# Altium footprint library 2020-09-26_17-27-19.PcbLib: 69 footprints (part 4 of 5)
Each footprint in its own frame and in the unit in brackets; x right, y up, seen from the top. Pads: shape width x height; smd on the part's side, far side on the other; paste and mask are expansions set on the pad; w line width, h text height; cw(c..) or ccw(c..) is an arc to the next point about the centre after c.
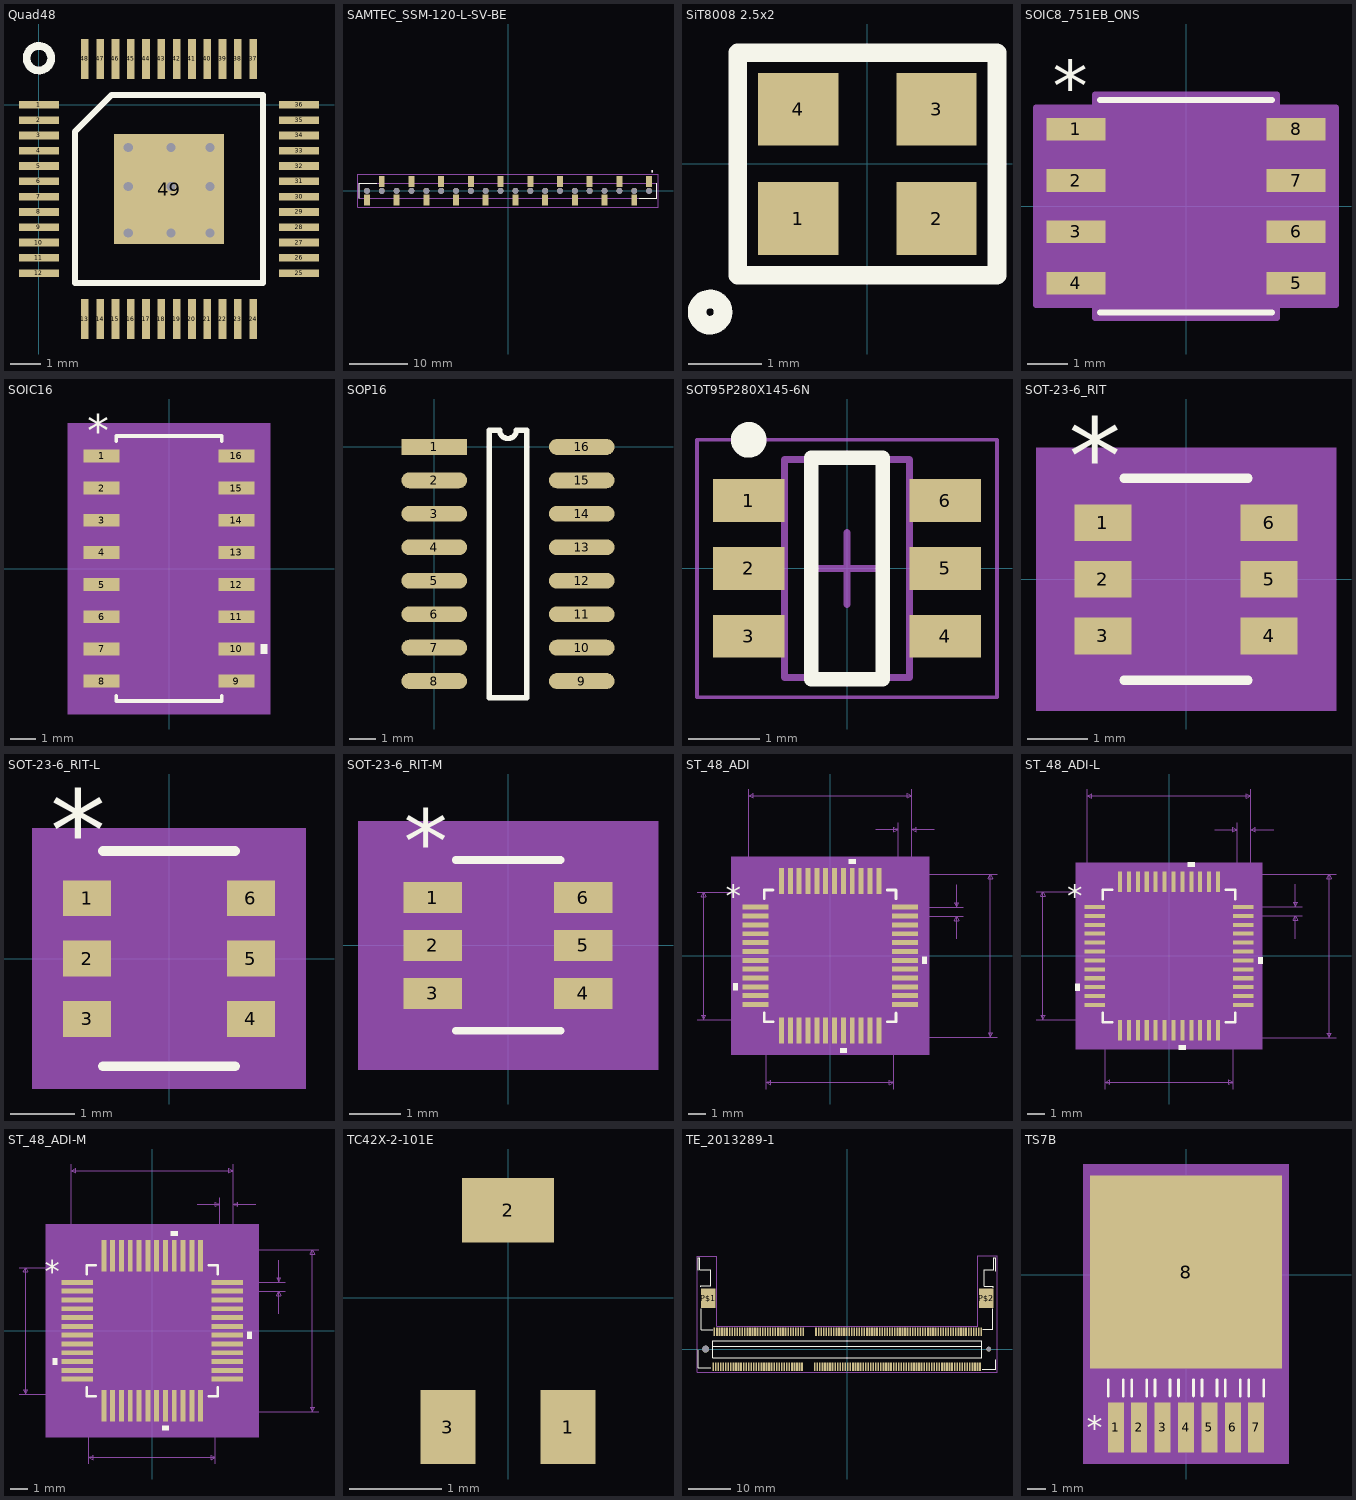
[diagram p3: the footprints below, top view; thin cyan lines are the x and y axes]

## Quad48 [mm]
pads (49):
  rect 1.3x0.25 smd: 1(0,0) 2(0,-0.5) 3(0,-1) 4(0,-1.5) 5(0,-2) 6(0,-2.5) 7(0,-3) 8(0,-3.5) 9(0,-4) 10(0,-4.5) 11(0,-5) 12(0,-5.5) 25(8.5,-5.5) 26(8.5,-5) 27(8.5,-4.5) 28(8.5,-4) 29(8.5,-3.5) 30(8.5,-3) 31(8.5,-2.5) 32(8.5,-2) 33(8.5,-1.5) 34(8.5,-1) 35(8.5,-0.5) 36(8.5,0)
  rect 0.25x1.3 smd: 13(1.5,-7) 14(2,-7) 15(2.5,-7) 16(3,-7) 17(3.5,-7) 18(4,-7) 19(4.5,-7) 20(5,-7) 21(5.5,-7) 22(6,-7) 23(6.5,-7) 24(7,-7) 37(7,1.5) 38(6.5,1.5) 39(6,1.5) 40(5.5,1.5) 41(5,1.5) 42(4.5,1.5) 43(4,1.5) 44(3.5,1.5) 45(3,1.5) 46(2.5,1.5) 47(2,1.5) 48(1.5,1.5)
  rect 3.6x3.6 smd: 49(4.25,-2.75)
via 4.318,-2.667 diameter 0.5 hole 0.3
via 2.921,-2.667 diameter 0.5 hole 0.3
via 2.921,-4.191 diameter 0.5 hole 0.3
via 4.318,-4.191 diameter 0.5 hole 0.3
via 5.588,-4.191 diameter 0.5 hole 0.3
via 5.588,-2.667 diameter 0.5 hole 0.3
via 5.588,-1.397 diameter 0.5 hole 0.3
via 4.318,-1.397 diameter 0.5 hole 0.3
via 2.921,-1.397 diameter 0.5 hole 0.3
Top Overlay:
  circle w0.254: c0,1.524 r0.402
  lines w0.2: 1.185,-5.815 7.315,-5.815 7.315,0.315 2.37,0.315 1.185,-0.87 1.185,-5.815
3D body "SQFP 48 LTC8602.step": height 2, standoff 0, extent -0.25,-7.25 8.75,1.75

## SAMTEC_SSM-120-L-SV-BE [mm]
pads (40):
  rect 1.02x1.905 smd: 01(24.13,1.603) 02(21.59,-1.603) 03(19.05,1.603) 04(16.51,-1.603) 05(13.97,1.603) 06(11.43,-1.603) 07(8.89,1.603) 08(6.35,-1.603) 09(3.81,1.603) 10(1.27,-1.603) 11(-1.27,1.603) 12(-3.81,-1.603) 13(-6.35,1.603) 14(-8.89,-1.603) 15(-11.43,1.603) 16(-13.97,-1.603) 17(-16.51,1.603) 18(-19.05,-1.603) 19(-21.59,1.603) 20(-24.13,-1.603)
  round 1.02 hole 1.02 unplated: ""(-24.13,0) ""(-21.59,0) ""(-19.05,0) ""(-16.51,0) ""(-13.97,0) ""(-11.43,0) ""(-8.89,0) ""(-6.35,0) ""(-3.81,0) ""(-1.27,0) ""(1.27,0) ""(3.81,0) ""(6.35,0) ""(8.89,0) ""(11.43,0) ""(13.97,0) ""(16.51,0) ""(19.05,0) ""(21.59,0) ""(24.13,0)
Top Overlay:
  circle w0.2: c24.64,3.315 r0.1
  lines w0.2: -25.4,-1.27 -25.4,1.27 -22.45,1.27 ; 22.45,-1.27 25.4,-1.27 25.4,1.27
Mechanical 13:
  circle w0.2: c24.64,3.315 r0.1
  lines w0.1: -25.4,-1.27 -25.4,1.27 25.4,1.27 25.4,-1.27 -25.4,-1.27
Mechanical 15:
  lines w0.05: -25.65,-2.805 -25.65,2.805 25.65,2.805 25.65,-2.805 -25.65,-2.805

## SiT8008 2.5x2 [mm]
pads (4):
  rect 1.1x1 smd: 1(-0.95,-0.75) 2(0.95,-0.75) 3(0.95,0.75) 4(-0.95,0.75)
Top Overlay:
  circle w0.254: c-2.159,-2.032 r0.18
  lines w0.254: -1.778,-1.524 -1.778,1.524 1.778,1.524 1.778,-1.524 -1.778,-1.524

## SOIC8_751EB_ONS [mil]
pads (8):
  rect 57.5x22 smd paste+0 mask+0: 1(-107.25,75) 2(-107.25,25) 3(-107.25,-25) 4(-107.25,-75) 5(107.25,-75) 6(107.25,-25) 7(107.25,25) 8(107.25,75)
Top Overlay:
  lines w6: -83.5,-103.5 83.5,-103.5 ; -83.5,103.5 83.5,103.5
  text "*" at -129.75,92 h50
Mechanical 13:
  lines w0: -12,98.5 ccw(c0,98.5) 12,98.5
  lines w1: -122,-85 -122,-65 -78.5,-65 -78.5,-85 -122,-85 ; -122,-35 -122,-15 -78.5,-15 -78.5,-35 -122,-35 ; -122,15 -122,35 -78.5,35 -78.5,15 -122,15 ; -122,65 -122,85 -78.5,85 -78.5,65 -122,65 ; -78.5,-98.5 78.5,-98.5 78.5,98.5 -78.5,98.5 -78.5,-98.5 ; 78.5,-85 78.5,-65 122,-65 122,-85 78.5,-85 ; 78.5,-35 78.5,-15 122,-15 122,-35 78.5,-35 ; 78.5,15 78.5,35 122,35 122,15 78.5,15 ; 78.5,65 78.5,85 122,85 122,65 78.5,65
  text "*" at -76,45.5 h50
Mechanical 15:
  region: -88.5,-96 -146,-96 -146,96 -88.5,96 -88.5,108.5 88.5,108.5 88.5,96 146,96 146,-96 88.5,-96 88.5,-108.5 -88.5,-108.5
  lines w6: -146,-96 -146,96 -88.5,96 -88.5,108.5 88.5,108.5 88.5,96 146,96 146,-96 88.5,-96 88.5,-108.5 -88.5,-108.5 -88.5,-96 -146,-96
3D body "SOIC8_751EB_ONS.step": height 69.09, standoff 0, extent -122.01,-98.5 122.01,98.5

## SOIC16 [mil]
pads (16):
  rect 55.5x20 smd paste+0 mask+0: 1(-104.75,175) 2(-104.75,125) 3(-104.75,75) 4(-104.75,25) 5(-104.75,-25) 6(-104.75,-75) 7(-104.75,-125) 8(-104.75,-175) 9(104.75,-175) 10(104.75,-125) 11(104.75,-75) 12(104.75,-25) 13(104.75,25) 14(104.75,75) 15(104.75,125) 16(104.75,175)
Top Overlay:
  region: 142.5,-117.5 152.5,-117.5 152.5,-132.5 142.5,-132.5
  lines w6: -82,-198.1 -82,-206 82,-206 82,-198.1 ; -82,198.1 -82,206 82,206 82,198.1
  text "*" at -127.25,190 h50
Mechanical 5:
  region: 157.5,-226 -157.5,-226 -157.5,226 157.5,226
Mechanical 13:
  lines w0: -12,201 ccw(c0,201) 12,201
  lines w1: -118.5,-184 -118.5,-166 -77,-166 -77,-184 -118.5,-184 ; -118.5,-134 -118.5,-116 -77,-116 -77,-134 -118.5,-134 ; -118.5,-84 -118.5,-66 -77,-66 -77,-84 -118.5,-84 ; -118.5,-34 -118.5,-16 -77,-16 -77,-34 -118.5,-34 ; -118.5,16 -118.5,34 -77,34 -77,16 -118.5,16 ; -118.5,66 -118.5,84 -77,84 -77,66 -118.5,66 ; -118.5,116 -118.5,134 -77,134 -77,116 -118.5,116 ; -118.5,166 -118.5,184 -77,184 -77,166 -118.5,166 ; -77,-201 77,-201 77,201 -77,201 -77,-201 ; 77,-184 77,-166 118.5,-166 118.5,-184 77,-184 ; 77,-134 77,-116 118.5,-116 118.5,-134 77,-134 ; 77,-84 77,-66 118.5,-66 118.5,-84 77,-84 ; 77,-34 77,-16 118.5,-16 118.5,-34 77,-34 ; 77,16 77,34 118.5,34 118.5,16 77,16 ; 77,66 77,84 118.5,84 118.5,66 77,66 ; 77,116 77,134 118.5,134 118.5,116 77,116 ; 77,166 77,184 118.5,184 118.5,166 77,166
  text "*" at -74.5,148 h50
Mechanical 15:
  region: -87,-195 -142.5,-195 -142.5,195 -87,195 -87,211 87,211 87,195 142.5,195 142.5,-195 87,-195 87,-211 -87,-211
  lines w6: -142.5,-195 -142.5,195 -87,195 -87,211 87,211 87,195 142.5,195 142.5,-195 87,-195 87,-211 -87,-211 -87,-195 -142.5,-195
3D body "SOIC16_z90.stp": height 61.42, standoff 0, extent -118.11,-200.78 118.11,200.79
3D body: height 10, standoff 0, extent 0,0 10,10

## SOP16 [mm]
pads (16):
  rect 2.5x0.6 smd: 1(0,0)
  oval 2.5x0.6 smd: 2(0,-1.27) 3(0,-2.54) 4(0,-3.81) 5(0,-5.08) 6(0,-6.35) 7(0,-7.62) 8(0,-8.89) 9(5.6,-8.89) 10(5.6,-7.62) 11(5.6,-6.35) 12(5.6,-5.08) 13(5.6,-3.81) 14(5.6,-2.54) 15(5.6,-1.27) 16(5.6,0)
Top Overlay:
  lines w0.2: 2.085,-9.525 3.515,-9.525 3.515,0.635 3.117,0.635 cw(c2.8,0.635) 2.482,0.635 2.085,0.635 2.085,-9.525

## SOT95P280X145-6N [mm] "SOT23, 6-Leads, Body 2.90x2.80mm, Pitch 0.95mm, IPC Medium Density"
height 1.45
pads (6):
  rect 1x0.6 smd: 1(-1.375,0.95) 2(-1.375,0) 3(-1.375,-0.95) 4(1.375,-0.95) 5(1.375,0) 6(1.375,0.95)
Top Overlay:
  circle w0.25: c-1.375,1.8 r0.125
  lines w0.2: -0.5,-1.55 -0.5,1.55 0.5,1.55 0.5,-1.55 -0.5,-1.55
Mechanical 13:
  lines w0.1: -0.875,-1.525 0.875,-1.525 0.875,1.525 -0.875,1.525 -0.875,-1.525
Mechanical 15:
  lines w0.05: -2.1,-1.8 2.1,-1.8 2.1,1.8 -2.1,1.8 -2.1,-1.8
  lines w0.1: -0.5,0 0.5,0 ; 0,-0.5 0,0.5
3D body "SOT95P280X145-6N.step": height 1.45, standoff 0, extent -1.5,-1.525 1.5,1.525

## SOT-23-6_RIT [mil]
pads (6):
  rect 37.5x24 smd paste+0 mask+0: 1(-54.25,37) 2(-54.25,0) 3(-54.25,-37) 4(54.25,-37) 5(54.25,0) 6(54.25,37)
Top Overlay:
  lines w6: -40.5,-66 40.5,-66 ; -40.5,66 40.5,66
  text "*" at -76.75,56 h50
Mechanical 5:
  region: 98,-86 -98,-86 -98,86 98,86
Mechanical 13:
  lines w0: -12,61 ccw(c0,61) 12,61
  lines w1: -59,-48 -35.5,-48 -35.5,-26 -59,-26 -59,-48 ; -59,-11 -35.5,-11 -35.5,11 -59,11 -59,-11 ; -59,26 -35.5,26 -35.5,48 -59,48 -59,26 ; -35.5,-61 -35.5,61 35.5,61 35.5,-61 -35.5,-61 ; 35.5,-48 59,-48 59,-26 35.5,-26 35.5,-48 ; 35.5,-11 59,-11 59,11 35.5,11 35.5,-11 ; 35.5,26 59,26 59,48 35.5,48 35.5,26
  text "*" at -33,8 h50
Mechanical 15:
  region: -45.5,-59 -83,-59 -83,59 -45.5,59 -45.5,71 45.5,71 45.5,59 83,59 83,-59 45.5,-59 45.5,-71 -45.5,-71
  lines w6: -83,-59 -45.5,-59 -45.5,-71 45.5,-71 45.5,-59 83,-59 83,59 45.5,59 45.5,71 -45.5,71 -45.5,59 -83,59 -83,-59
3D body "SOT-23-6_RIT.step": height 51.1, standoff 0, extent -59.02,-60.98 59.02,60.98

## SOT-23-6_RIT-L [mil]
pads (6):
  rect 29.5x22 smd paste+0 mask+0: 1(-50.25,37) 2(-50.25,0) 3(-50.25,-37) 4(50.25,-37) 5(50.25,0) 6(50.25,37)
Top Overlay:
  lines w6: -40.5,-66 40.5,-66 ; -40.5,66 40.5,66
  text "*" at -72.75,54 h50
Mechanical 5:
  region: 84,-80 -84,-80 -84,80 84,80
Mechanical 13:
  lines w0: -12,61 ccw(c0,61) 12,61
  lines w1: -59,-48 -59,-26 -35.5,-26 -35.5,-48 -59,-48 ; -59,-11 -59,11 -35.5,11 -35.5,-11 -59,-11 ; -59,26 -59,48 -35.5,48 -35.5,26 -59,26 ; -35.5,-61 35.5,-61 35.5,61 -35.5,61 -35.5,-61 ; 35.5,-48 35.5,-26 59,-26 59,-48 35.5,-48 ; 35.5,-11 35.5,11 59,11 59,-11 35.5,-11 ; 35.5,26 35.5,48 59,48 59,26 35.5,26
  text "*" at -33,8 h50
Mechanical 15:
  region: -39.5,-52 -69,-52 -69,52 -39.5,52 -39.5,65 39.5,65 39.5,52 69,52 69,-52 39.5,-52 39.5,-65 -39.5,-65
  lines w6: -69,-52 -69,52 -39.5,52 -39.5,65 39.5,65 39.5,52 69,52 69,-52 39.5,-52 39.5,-65 -39.5,-65 -39.5,-52 -69,-52
3D body "SOT-23-6_RIT.step": height 51.1, standoff 0, extent -59.02,-60.98 59.02,60.98

## SOT-23-6_RIT-M [mil]
pads (6):
  rect 45.5x24 smd paste+0 mask+0: 1(-58.25,37) 2(-58.25,0) 3(-58.25,-37) 4(58.25,-37) 5(58.25,0) 6(58.25,37)
Top Overlay:
  lines w6: -40.5,-66 40.5,-66 ; -40.5,66 40.5,66
  text "*" at -80.75,56 h50
Mechanical 5:
  region: 116,-96 -116,-96 -116,96 116,96
Mechanical 13:
  lines w0: -12,61 ccw(c0,61) 12,61
  lines w1: -59,-48 -59,-26 -35.5,-26 -35.5,-48 -59,-48 ; -59,-11 -59,11 -35.5,11 -35.5,-11 -59,-11 ; -59,26 -59,48 -35.5,48 -35.5,26 -59,26 ; -35.5,-61 35.5,-61 35.5,61 -35.5,61 -35.5,-61 ; 35.5,-48 35.5,-26 59,-26 59,-48 35.5,-48 ; 35.5,-11 35.5,11 59,11 59,-11 35.5,-11 ; 35.5,26 35.5,48 59,48 59,26 35.5,26
  text "*" at -33,8 h50
Mechanical 15:
  region: -55.5,-69 -101,-69 -101,69 -55.5,69 -55.5,81 55.5,81 55.5,69 101,69 101,-69 55.5,-69 55.5,-81 -55.5,-81
  lines w6: -101,-69 -101,69 -55.5,69 -55.5,81 55.5,81 55.5,69 101,69 101,-69 55.5,-69 55.5,-81 -55.5,-81 -55.5,-69 -101,-69
3D body "SOT-23-6_RIT.step": height 51.1, standoff 0, extent -59.02,-60.98 59.02,60.98

## ST_48_ADI [mil]
pads (48):
  rect 58x11 smd paste+0 mask+0: 1(-166,108.27) 2(-166,88.58) 3(-166,68.9) 4(-166,49.21) 5(-166,29.53) 6(-166,9.84) 7(-166,-9.84) 8(-166,-29.53) 9(-166,-49.21) 10(-166,-68.9) 11(-166,-88.58) 12(-166,-108.27) 25(166,-108.27) 26(166,-88.58) 27(166,-68.9) 28(166,-49.21) 29(166,-29.53) 30(166,-9.84) 31(166,9.84) 32(166,29.53) 33(166,49.21) 34(166,68.9) 35(166,88.58) 36(166,108.27)
  rect 11x58 smd paste+0 mask+0: 13(-108.27,-166) 14(-88.58,-166) 15(-68.9,-166) 16(-49.21,-166) 17(-29.53,-166) 18(-9.84,-166) 19(9.84,-166) 20(29.53,-166) 21(49.21,-166) 22(68.9,-166) 23(88.58,-166) 24(108.27,-166) 37(108.27,166) 38(88.58,166) 39(68.9,166) 40(49.21,166) 41(29.53,166) 42(9.84,166) 43(-9.84,166) 44(-29.53,166) 45(-49.21,166) 46(-68.9,166) 47(-88.58,166) 48(-108.27,166)
Top Overlay:
  region: -205,-61.4 -215,-61.4 -215,-76.4 -205,-76.4
  region: 37.03,-205 22.03,-205 22.03,-215 37.03,-215
  region: 205,-2.34 215,-2.34 215,-17.34 205,-17.34
  region: 56.71,205 41.71,205 41.71,215 56.71,215
  lines w6: -146.5,-126.87 -146.5,-146.5 -126.87,-146.5 ; -146.5,126.87 -146.5,146.5 -126.87,146.5 ; 126.87,-146.5 146.5,-146.5 146.5,-126.87 ; 126.87,146.5 146.5,146.5 146.5,126.87
  text "*" at -232.5,108.11 h50
Mechanical 5:
  region: 220,-220 -220,-220 -220,220 220,220
Mechanical 7:
  lines w1: -296,-141.5 -108.27,-141.5 ; -296,141.5 -108.27,141.5 ; -181,108.27 -181,371 ; -141.5,-296 -141.5,-108.27 ; 101,281 151,281 ; 108.27,-181 371,-181 ; 108.27,181 371,181 ; 141.5,-296 141.5,-108.27 ; 151,108.27 151,296 ; 166,88.58 296,88.58 ; 166,108.27 296,108.27 ; 181,296 181,108.27 181,371 ; 231,281 181,281 ; 281,38.58 281,88.58 ; 281,158.27 281,108.27 ; -281,-141.5 -281,141.5 ; -281,-141.5 -286,-131.5 -276,-131.5 -281,-141.5 ; -281,141.5 -286,131.5 -276,131.5 -281,141.5 ; -181,356 181,356 ; -181,356 -171,361 -171,351 -181,356 ; -141.5,-281 141.5,-281 ; -141.5,-281 -131.5,-276 -131.5,-286 -141.5,-281 ; 141.5,-281 131.5,-276 131.5,-286 141.5,-281 ; 151,281 141,286 141,276 151,281 ; 181,281 191,286 191,276 181,281 ; 181,356 171,361 171,351 181,356 ; 281,88.58 276,78.58 286,78.58 281,88.58 ; 281,108.27 276,118.27 286,118.27 281,108.27 ; 356,-181 356,181 ; 356,-181 351,-171 361,-171 356,-181 ; 356,181 351,171 361,171 356,181
  text "Default Horiz Padstyle: RX11Y58D0T" at -425,-431 h50
  text "Default Vert Padstyle: RX11Y58D0T" at -412.5,-491 h50
  text "Alt 1 Padstyle: OX60Y90D30P" at -337.5,-671 h50
  text "Alt 2 Padstyle: OX90Y60D30P" at -337.5,-731 h50
  text "0.02in/0.5mm" at 301,85.93 h25
  text "0.03in/0.762mm" at 78.5,301 h25
  text "0.362in/9.195mm" at -93.75,376 h25
  text "0.283in/7.188mm" at -93.75,-326 h25
  text "0.283in/7.188mm" at -488.5,-12.5 h25
  text "0.362in/9.195mm" at 376,-12.5 h25
Mechanical 13:
  drawing of 197 lines, arcs and shapes, not listed
  text "*" at -139,93.11 h50
Mechanical 15:
  region: -123.77,-151.5 -151.5,-151.5 -151.5,-123.77 -205,-123.77 -205,123.77 -151.5,123.77 -151.5,151.5 -123.77,151.5 -123.77,205 123.77,205 123.77,151.5 151.5,151.5 151.5,123.77 205,123.77 205,-123.77 151.5,-123.77 151.5,-151.5 123.77,-151.5 123.77,-205 -123.77,-205
  lines w6: -205,-123.77 -151.5,-123.77 -151.5,-151.5 -123.77,-151.5 -123.77,-205 123.77,-205 123.77,-151.5 151.5,-151.5 151.5,-123.77 205,-123.77 205,123.77 151.5,123.77 151.5,151.5 123.77,151.5 123.77,205 -123.77,205 -123.77,151.5 -151.5,151.5 -151.5,123.77 -205,123.77 -205,-123.77
3D body: height 10, standoff 0, extent 0,0 10,10

## ST_48_ADI-L [mil]
pads (48):
  rect 46x9 smd paste+0 mask+0: 1(-164,108.27) 2(-164,88.58) 3(-164,68.9) 4(-164,49.21) 5(-164,29.53) 6(-164,9.84) 7(-164,-9.84) 8(-164,-29.53) 9(-164,-49.21) 10(-164,-68.9) 11(-164,-88.58) 12(-164,-108.27) 25(164,-108.27) 26(164,-88.58) 27(164,-68.9) 28(164,-49.21) 29(164,-29.53) 30(164,-9.84) 31(164,9.84) 32(164,29.53) 33(164,49.21) 34(164,68.9) 35(164,88.58) 36(164,108.27)
  rect 9x46 smd paste+0 mask+0: 13(-108.27,-164) 14(-88.58,-164) 15(-68.9,-164) 16(-49.21,-164) 17(-29.53,-164) 18(-9.84,-164) 19(9.84,-164) 20(29.53,-164) 21(49.21,-164) 22(68.9,-164) 23(88.58,-164) 24(108.27,-164) 37(108.27,164) 38(88.58,164) 39(68.9,164) 40(49.21,164) 41(29.53,164) 42(9.84,164) 43(-9.84,164) 44(-29.53,164) 45(-49.21,164) 46(-68.9,164) 47(-88.58,164) 48(-108.27,164)
Top Overlay:
  region: -197,-61.4 -207,-61.4 -207,-76.4 -197,-76.4
  region: 37.03,-197 22.03,-197 22.03,-207 37.03,-207
  region: 197,-2.34 207,-2.34 207,-17.34 197,-17.34
  region: 56.71,197 41.71,197 41.71,207 56.71,207
  lines w6: -146.5,-125.87 -146.5,-146.5 -125.87,-146.5 ; -146.5,125.87 -146.5,146.5 -125.87,146.5 ; 125.87,-146.5 146.5,-146.5 146.5,-125.87 ; 125.87,146.5 146.5,146.5 146.5,125.87
  text "*" at -224.5,108.11 h50
Mechanical 5:
  region: 206,-206 -206,-206 -206,206 206,206
Mechanical 7:
  lines w1: -294,-141.5 -108.27,-141.5 ; -294,141.5 -108.27,141.5 ; -181,108.27 -181,369 ; -141.5,-294 -141.5,-108.27 ; 101,279 151,279 ; 108.27,-181 369,-181 ; 108.27,181 369,181 ; 141.5,-294 141.5,-108.27 ; 151,108.27 151,294 ; 164,88.58 294,88.58 ; 164,108.27 294,108.27 ; 181,294 181,108.27 181,369 ; 231,279 181,279 ; 279,38.58 279,88.58 ; 279,158.27 279,108.27 ; -279,-141.5 -279,141.5 ; -279,-141.5 -284,-131.5 -274,-131.5 -279,-141.5 ; -279,141.5 -284,131.5 -274,131.5 -279,141.5 ; -181,354 181,354 ; -181,354 -171,359 -171,349 -181,354 ; -141.5,-279 141.5,-279 ; -141.5,-279 -131.5,-274 -131.5,-284 -141.5,-279 ; 141.5,-279 131.5,-274 131.5,-284 141.5,-279 ; 151,279 141,284 141,274 151,279 ; 181,279 191,284 191,274 181,279 ; 181,354 171,359 171,349 181,354 ; 279,88.58 274,78.58 284,78.58 279,88.58 ; 279,108.27 274,118.27 284,118.27 279,108.27 ; 354,-181 354,181 ; 354,-181 349,-171 359,-171 354,-181 ; 354,181 349,171 359,171 354,181
  text "Default Horiz Padstyle: RX9Y46D0T" at -412.5,-429 h50
  text "Default Vert Padstyle: RX9Y46D0T" at -400,-489 h50
  text "Alt 1 Padstyle: OX60Y90D30P" at -337.5,-669 h50
  text "Alt 2 Padstyle: OX90Y60D30P" at -337.5,-729 h50
  text "0.02in/0.5mm" at 299,85.93 h25
  text "0.03in/0.762mm" at 78.5,299 h25
  text "0.362in/9.195mm" at -93.75,374 h25
  text "0.283in/7.188mm" at -93.75,-324 h25
  text "0.283in/7.188mm" at -486.5,-12.5 h25
  text "0.362in/9.195mm" at 374,-12.5 h25
Mechanical 13:
  drawing of 197 lines, arcs and shapes, not listed
  text "*" at -139,93.11 h50
Mechanical 15:
  region: -116.77,-145.5 -145.5,-145.5 -145.5,-116.77 -191,-116.77 -191,116.77 -145.5,116.77 -145.5,145.5 -116.77,145.5 -116.77,191 116.77,191 116.77,145.5 145.5,145.5 145.5,116.77 191,116.77 191,-116.77 145.5,-116.77 145.5,-145.5 116.77,-145.5 116.77,-191 -116.77,-191
  lines w6: -191,-116.77 -145.5,-116.77 -145.5,-145.5 -116.77,-145.5 -116.77,-191 116.77,-191 116.77,-145.5 145.5,-145.5 145.5,-116.77 191,-116.77 191,116.77 145.5,116.77 145.5,145.5 116.77,145.5 116.77,191 -116.77,191 -116.77,145.5 -145.5,145.5 -145.5,116.77 -191,116.77 -191,-116.77
3D body: height 10, standoff 0, extent 0,0 10,10

## ST_48_ADI-M [mil]
pads (48):
  rect 70x11 smd paste+0 mask+0: 1(-168,108.27) 2(-168,88.58) 3(-168,68.9) 4(-168,49.21) 5(-168,29.53) 6(-168,9.84) 7(-168,-9.84) 8(-168,-29.53) 9(-168,-49.21) 10(-168,-68.9) 11(-168,-88.58) 12(-168,-108.27) 25(168,-108.27) 26(168,-88.58) 27(168,-68.9) 28(168,-49.21) 29(168,-29.53) 30(168,-9.84) 31(168,9.84) 32(168,29.53) 33(168,49.21) 34(168,68.9) 35(168,88.58) 36(168,108.27)
  rect 11x70 smd paste+0 mask+0: 13(-108.27,-168) 14(-88.58,-168) 15(-68.9,-168) 16(-49.21,-168) 17(-29.53,-168) 18(-9.84,-168) 19(9.84,-168) 20(29.53,-168) 21(49.21,-168) 22(68.9,-168) 23(88.58,-168) 24(108.27,-168) 37(108.27,168) 38(88.58,168) 39(68.9,168) 40(49.21,168) 41(29.53,168) 42(9.84,168) 43(-9.84,168) 44(-29.53,168) 45(-49.21,168) 46(-68.9,168) 47(-88.58,168) 48(-108.27,168)
Top Overlay:
  region: -213,-61.4 -223,-61.4 -223,-76.4 -213,-76.4
  region: 37.03,-213 22.03,-213 22.03,-223 37.03,-223
  region: 213,-2.34 223,-2.34 223,-17.34 213,-17.34
  region: 56.71,213 41.71,213 41.71,223 56.71,223
  lines w6: -146.5,-126.87 -146.5,-146.5 -126.87,-146.5 ; -146.5,126.87 -146.5,146.5 -126.87,146.5 ; 126.87,-146.5 146.5,-146.5 146.5,-126.87 ; 126.87,146.5 146.5,146.5 146.5,126.87
  text "*" at -240.5,108.11 h50
Mechanical 5:
  region: 238,-238 -238,-238 -238,238 238,238
Mechanical 7:
  lines w1: -298,-141.5 -108.27,-141.5 ; -298,141.5 -108.27,141.5 ; -181,108.27 -181,373 ; -141.5,-298 -141.5,-108.27 ; 101,283 151,283 ; 108.27,-181 373,-181 ; 108.27,181 373,181 ; 141.5,-298 141.5,-108.27 ; 151,108.27 151,298 ; 168,88.58 298,88.58 ; 168,108.27 298,108.27 ; 181,298 181,108.27 181,373 ; 231,283 181,283 ; 283,38.58 283,88.58 ; 283,158.27 283,108.27 ; -283,-141.5 -283,141.5 ; -283,-141.5 -288,-131.5 -278,-131.5 -283,-141.5 ; -283,141.5 -288,131.5 -278,131.5 -283,141.5 ; -181,358 181,358 ; -181,358 -171,363 -171,353 -181,358 ; -141.5,-283 141.5,-283 ; -141.5,-283 -131.5,-278 -131.5,-288 -141.5,-283 ; 141.5,-283 131.5,-278 131.5,-288 141.5,-283 ; 151,283 141,288 141,278 151,283 ; 181,283 191,288 191,278 181,283 ; 181,358 171,363 171,353 181,358 ; 283,88.58 278,78.58 288,78.58 283,88.58 ; 283,108.27 278,118.27 288,118.27 283,108.27 ; 358,-181 358,181 ; 358,-181 353,-171 363,-171 358,-181 ; 358,181 353,171 363,171 358,181
  text "Default Horiz Padstyle: RX11Y70D0T" at -425,-433 h50
  text "Default Vert Padstyle: RX11Y70D0T" at -412.5,-493 h50
  text "Alt 1 Padstyle: OX60Y90D30P" at -337.5,-673 h50
  text "Alt 2 Padstyle: OX90Y60D30P" at -337.5,-733 h50
  text "0.02in/0.5mm" at 303,85.93 h25
  text "0.03in/0.762mm" at 78.5,303 h25
  text "0.362in/9.195mm" at -93.75,378 h25
  text "0.283in/7.188mm" at -93.75,-328 h25
  text "0.283in/7.188mm" at -490.5,-12.5 h25
  text "0.362in/9.195mm" at 378,-12.5 h25
Mechanical 13:
  drawing of 197 lines, arcs and shapes, not listed
  text "*" at -139,93.11 h50
Mechanical 15:
  region: -133.77,-161.5 -161.5,-161.5 -161.5,-133.77 -223,-133.77 -223,133.77 -161.5,133.77 -161.5,161.5 -133.77,161.5 -133.77,223 133.77,223 133.77,161.5 161.5,161.5 161.5,133.77 223,133.77 223,-133.77 161.5,-133.77 161.5,-161.5 133.77,-161.5 133.77,-223 -133.77,-223
  lines w6: -223,-133.77 -161.5,-133.77 -161.5,-161.5 -133.77,-161.5 -133.77,-223 133.77,-223 133.77,-161.5 161.5,-161.5 161.5,-133.77 223,-133.77 223,133.77 161.5,133.77 161.5,161.5 133.77,161.5 133.77,223 -133.77,223 -133.77,161.5 -161.5,161.5 -161.5,133.77 -223,133.77 -223,-133.77
3D body: height 10, standoff 0, extent 0,0 10,10

## TC42X-2-101E [mm] "Potentiometer low profile"
pads (3):
  rect 0.6x0.8 smd: 1(0.65,-1.4) 3(-0.65,-1.4)
  rect 1x0.7 smd: 2(0,0.95)
3D body "TC42X-2-101E.STEP": height 0.9, standoff 0, extent -1.1,-1.65 1.1,1.15

## TE_2013289-1 [mm]
pads (208):
  rect 0.4x2 smd: 1(-31.6,-4.1) 2(-31.3,4.1) 3(-31,-4.1) 4(-30.7,4.1) 5(-30.4,-4.1) 6(-30.1,4.1) 7(-29.8,-4.1) 8(-29.5,4.1) 9(-29.2,-4.1) 10(-28.9,4.1) 11(-28.6,-4.1) 12(-28.3,4.1) 13(-28,-4.1) 14(-27.7,4.1) 15(-27.4,-4.1) 16(-27.1,4.1) 17(-26.8,-4.1) 18(-26.5,4.1) 19(-26.2,-4.1) 20(-25.9,4.1) 21(-25.6,-4.1) 22(-25.3,4.1) 23(-25,-4.1) 24(-24.7,4.1) 25(-24.4,-4.1) 26(-24.1,4.1) 27(-23.8,-4.1) 28(-23.5,4.1) 29(-23.2,-4.1) 30(-22.9,4.1) 31(-22.6,-4.1) 32(-22.3,4.1) 33(-22,-4.1) 34(-21.7,4.1) 35(-21.4,-4.1) 36(-21.1,4.1) 37(-20.8,-4.1) 38(-20.5,4.1) 39(-20.2,-4.1) 40(-19.9,4.1) 41(-19.6,-4.1) 42(-19.3,4.1) 43(-19,-4.1) 44(-18.7,4.1) 45(-18.4,-4.1) 46(-18.1,4.1) 47(-17.8,-4.1) 48(-17.5,4.1) 49(-17.2,-4.1) 50(-16.9,4.1) 51(-16.6,-4.1) 52(-16.3,4.1) 53(-16,-4.1) 54(-15.7,4.1) 55(-15.4,-4.1) 56(-15.1,4.1) 57(-14.8,-4.1) 58(-14.5,4.1) 59(-14.2,-4.1) 60(-13.9,4.1) 61(-13.6,-4.1) 62(-13.3,4.1) 63(-13,-4.1) 64(-12.7,4.1) 65(-12.4,-4.1) 66(-12.1,4.1) 67(-11.8,-4.1) 68(-11.5,4.1) 69(-11.2,-4.1) 70(-10.9,4.1) 71(-10.6,-4.1) 72(-10.3,4.1) 73(-7.6,-4.1) 74(-7.3,4.1) 75(-7,-4.1) 76(-6.7,4.1) 77(-6.4,-4.1) 78(-6.1,4.1) 79(-5.8,-4.1) 80(-5.5,4.1) 81(-5.2,-4.1) 82(-4.9,4.1) 83(-4.6,-4.1) 84(-4.3,4.1) 85(-4,-4.1) 86(-3.7,4.1) 87(-3.4,-4.1) 88(-3.1,4.1) 89(-2.8,-4.1) 90(-2.5,4.1) 91(-2.2,-4.1) 92(-1.9,4.1) 93(-1.6,-4.1) 94(-1.3,4.1) 95(-1,-4.1) 96(-0.7,4.1) 97(-0.4,-4.1) 98(-0.1,4.1) 99(0.2,-4.1) 100(0.5,4.1) 101(0.8,-4.1) 102(1.1,4.1) 103(1.4,-4.1) 104(1.7,4.1) 105(2,-4.1) 106(2.3,4.1) 107(2.6,-4.1) 108(2.9,4.1) 109(3.2,-4.1) 110(3.5,4.1) 111(3.8,-4.1) 112(4.1,4.1) 113(4.4,-4.1) 114(4.7,4.1) 115(5,-4.1) 116(5.3,4.1) 117(5.6,-4.1) 118(5.9,4.1) 119(6.2,-4.1) 120(6.5,4.1) 121(6.8,-4.1) 122(7.1,4.1) 123(7.4,-4.1) 124(7.7,4.1) 125(8,-4.1) 126(8.3,4.1) 127(8.6,-4.1) 128(8.9,4.1) 129(9.2,-4.1) 130(9.5,4.1) 131(9.8,-4.1) 132(10.1,4.1) 133(10.4,-4.1) 134(10.7,4.1) 135(11,-4.1) 136(11.3,4.1) 137(11.6,-4.1) 138(11.9,4.1) 139(12.2,-4.1) 140(12.5,4.1) 141(12.8,-4.1) 142(13.1,4.1) 143(13.4,-4.1) 144(13.7,4.1) 145(14,-4.1) 146(14.3,4.1) 147(14.6,-4.1) 148(14.9,4.1) 149(15.2,-4.1) 150(15.5,4.1) 151(15.8,-4.1) 152(16.1,4.1) 153(16.4,-4.1) 154(16.7,4.1) 155(17,-4.1) 156(17.3,4.1) 157(17.6,-4.1) 158(17.9,4.1) 159(18.2,-4.1) 160(18.5,4.1) 161(18.8,-4.1) 162(19.1,4.1) 163(19.4,-4.1) 164(19.7,4.1) 165(20,-4.1) 166(20.3,4.1) 167(20.6,-4.1) 168(20.9,4.1) 169(21.2,-4.1) 170(21.5,4.1) 171(21.8,-4.1) 172(22.1,4.1) 173(22.4,-4.1) 174(22.7,4.1) 175(23,-4.1) 176(23.3,4.1) 177(23.6,-4.1) 178(23.9,4.1) 179(24.2,-4.1) 180(24.5,4.1) 181(24.8,-4.1) 182(25.1,4.1) 183(25.4,-4.1) 184(25.7,4.1) 185(26,-4.1) 186(26.3,4.1) 187(26.6,-4.1) 188(26.9,4.1) 189(27.2,-4.1) 190(27.5,4.1) 191(27.8,-4.1) 192(28.1,4.1) 193(28.4,-4.1) 194(28.7,4.1) 195(29,-4.1) 196(29.3,4.1) 197(29.6,-4.1) 198(29.9,4.1) 199(30.2,-4.1) 200(30.5,4.1) 201(30.8,-4.1) 202(31.1,4.1) 203(31.4,-4.1) 204(31.7,4.1)
  rect 3.5x4.6 smd: P$1(-32.75,12) P$2(32.85,12)
  round 1.65 hole 1.65 unplated: ""(-33.35,0)
  round 1.15 hole 1.15 unplated: ""(33.45,0)
Top Overlay:
  lines w0.127: -35.1,-0.2 -35.1,-4.4 -32.1,-4.4 ; -35.1,18.6 -35.1,21.6 -34.8,21.6 -34.8,18.8 -32.2,18.8 -32.2,15 -34.5,15 -34.5,14.7 ; -34.4,9.5 -34.4,4.6 -31.7,4.6 ; 31.9,-4.7 35.1,-4.7 35.1,-2.5 ; 32,4.7 34.4,4.7 34.4,9.5 ; 34.5,14.5 34.5,14.8 32.4,14.8 32.4,18.8 34.6,18.8 34.6,21.6 35.1,21.6 35.1,18.4 ; -31.7,0.7 -31.7,2 31.8,2 31.8,0.7 ; -31.7,0.7 -31.7,-2 31.8,-2 31.8,0.7 ; -31.7,0.7 31.8,0.7
Mechanical 15:
  lines w0.127: -35.4,-5.4 35.4,-5.4 35.4,22 30.8,22 30.8,5.4 -30.7,5.4 -30.7,21.9 -35.4,21.9 -35.4,-5.4
3D body "sodimm.stp": height 5.52, standoff -0.63, extent -35.749,-5.017 35.851,21.523

## TS7B [mil]
pads (8):
  rect 34x106 smd: 1(-150,-326) 2(-100,-326) 3(-50,-326) 4(0,-326) 5(50,-326) 6(100,-326) 7(150,-326)
  rect 410x412 smd: 8(0,6)
Top Overlay:
  lines w6: -166,-259 -166,-224 ; -134,-259 -134,-224 ; -116,-259 -116,-224 ; -84,-259 -84,-224 ; -66,-259 -66,-224 ; -34,-259 -34,-224 ; -16,-259 -16,-224 ; 16,-259 16,-224 ; 34,-259 34,-224 ; 66,-259 66,-224 ; 84,-259 84,-224 ; 116,-259 116,-224 ; 134,-259 134,-224 ; 166,-259 166,-224
  text "*" at -212.5,-351 h50
Mechanical 5:
  region: -220,237 220,237 220,-404 -220,-404
Mechanical 13:
  lines w1: -205,-200 205,-200 205,200 -205,200 -205,-200 ; -166,-365 -166,-200 -134,-200 -134,-365 -166,-365 ; -116,-365 -116,-200 -84,-200 -84,-365 -116,-365 ; -66,-365 -66,-200 -34,-200 -34,-365 -66,-365 ; -16,-365 -16,-200 16,-200 16,-365 -16,-365 ; 34,-365 34,-200 66,-200 66,-365 34,-365 ; 84,-365 84,-200 116,-200 116,-365 84,-365 ; 134,-365 134,-200 166,-200 166,-365 134,-365
  text "*" at -212.5,-351 h50
Mechanical 15:
  region: 215,-389 -215,-389 -215,222 215,222
  lines w6: -215,-389 -215,222 215,222 215,-389 -215,-389
3D body "TS7B.step": height 189.09, standoff -2.01, extent -205,-277.52 205,200.12